# Altium schematic symbol library jlcpcb_2025_04_capacitors_extended_0402.schlib: 3594 symbols (part 12 of 20)
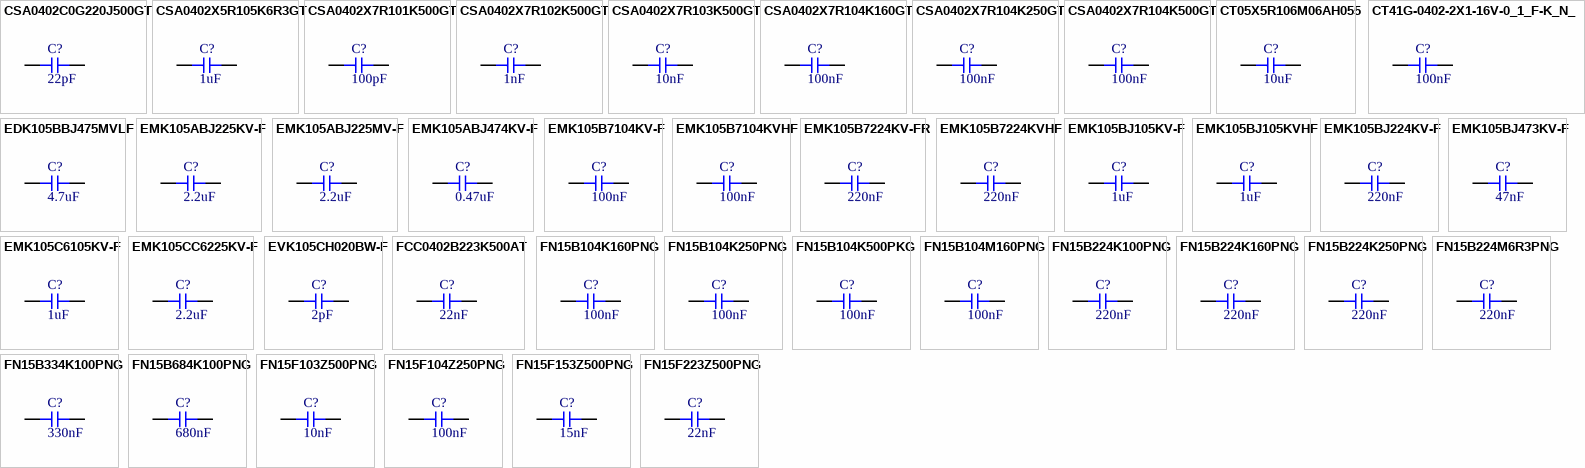
[diagram p100: symbols CSA0402C0G220J500GT to FN15F223Z500PNG]

## EMK105ABJ225KV-F
designator C?  Capacitance: 2.2uF  (hidden comment: *)
Capacitor, Ceramic (MLCC), 2.2uF, ±10%, 16V, X5R, ±10%, SMD 0402; Manufacturer: Taiyo Yuden; Manufacturer Part Number: EMK105ABJ225KV-F; Package Size: 0402; JLCPCB Basic Part: No; JLCPCB Part Number: C385887; Supplier 1: LCSC; Category: Capacitors - MLCC; Supplier Part Number 1: C385887; Tolerance: ±10%; Voltage Rating: 16V; Temperature Coefficient: X5R; RoHS: Yes; ComponentLink1Description: Datasheet; ComponentLink1URL: https://wmsc.lcsc.com/wmsc/upload/file/pdf/v2/lcsc/1912111437_Taiyo-Yuden-EMK105ABJ225KV-F_C385887.pdf; ComponentLink2Description: JLCPCB Part URL; ComponentLink2URL: https://jlcpcb.com/partdetail/C385887; ComponentLink3Description: LCSC Part URL; ComponentLink3URL: https://lcsc.com/product-detail/Multilayer-Ceramic-Capacitors-MLCC---SMD-SMT_Taiyo-Yuden-Taiyo-Yuden-EMK105ABJ225KV-F_C385887.html
footprint CAP-0402 (0402 (1005M) Capacitor)
pins: 1, 2

## EMK105ABJ225MV-F
designator C?  Capacitance: 2.2uF  (hidden comment: *)
Capacitor, Ceramic (MLCC), 2.2uF, ±20%, 16V, X5R, ±20%, SMD 0402; Manufacturer: Taiyo Yuden; Manufacturer Part Number: EMK105ABJ225MV-F; Package Size: 0402; JLCPCB Basic Part: No; JLCPCB Part Number: C412303; Supplier 1: LCSC; Category: Capacitors - MLCC; Supplier Part Number 1: C412303; Tolerance: ±20%; Voltage Rating: 16V; Temperature Coefficient: X5R; RoHS: Yes; ComponentLink1Description: Datasheet; ComponentLink1URL: https://wmsc.lcsc.com/wmsc/upload/file/pdf/v2/lcsc/2211282230_Taiyo-Yuden-EMK105ABJ225MV-F_C412303.pdf; ComponentLink2Description: JLCPCB Part URL; ComponentLink2URL: https://jlcpcb.com/partdetail/C412303; ComponentLink3Description: LCSC Part URL; ComponentLink3URL: https://lcsc.com/product-detail/Multilayer-Ceramic-Capacitors-MLCC---SMD-SMT_Taiyo-Yuden-Taiyo-Yuden-EMK105ABJ225MV-F_C412303.html
footprint CAP-0402 (0402 (1005M) Capacitor)
pins: 1, 2

## EMK105ABJ474KV-F
designator C?  Capacitance: 0.47uF  (hidden comment: *)
Capacitor, Ceramic (MLCC), 0.47uF, ±10%, 16V, X5R, ±10%, SMD 0402; Manufacturer: Taiyo Yuden; Manufacturer Part Number: EMK105ABJ474KV-F; Package Size: 0402; JLCPCB Basic Part: No; JLCPCB Part Number: C2169173; Supplier 1: LCSC; Category: Capacitors - MLCC; Supplier Part Number 1: C2169173; Tolerance: ±10%; Voltage Rating: 16V; Temperature Coefficient: X5R; RoHS: Yes; ComponentLink1Description: Datasheet; ComponentLink1URL: https://wmsc.lcsc.com/wmsc/upload/file/pdf/v2/lcsc/2211282030_Taiyo-Yuden-EMK105ABJ474KV-F_C2169173.pdf; ComponentLink2Description: JLCPCB Part URL; ComponentLink2URL: https://jlcpcb.com/partdetail/C2169173; ComponentLink3Description: LCSC Part URL; ComponentLink3URL: https://lcsc.com/product-detail/Multilayer-Ceramic-Capacitors-MLCC---SMD-SMT_Taiyo-Yuden-Taiyo-Yuden-EMK105ABJ474KV-F_C2169173.html
footprint CAP-0402 (0402 (1005M) Capacitor)
pins: 1, 2

## EMK105B7104KV-F
designator C?  Capacitance: 100nF  (hidden comment: *)
Capacitor, Ceramic (MLCC), 100nF, ±10%, 16V, X7R, ±10%, SMD 0402; Manufacturer: Taiyo Yuden; Manufacturer Part Number: EMK105B7104KV-F; Package Size: 0402; JLCPCB Basic Part: No; JLCPCB Part Number: C92753; Supplier 1: LCSC; Category: Capacitors - MLCC; Supplier Part Number 1: C92753; Tolerance: ±10%; Voltage Rating: 16V; Temperature Coefficient: X7R; RoHS: Yes; ComponentLink1Description: Datasheet; ComponentLink1URL: https://wmsc.lcsc.com/wmsc/upload/file/pdf/v2/lcsc/1810171713_Taiyo-Yuden-EMK105B7104KV-F_C92753.pdf; ComponentLink2Description: JLCPCB Part URL; ComponentLink2URL: https://jlcpcb.com/partdetail/C92753; ComponentLink3Description: LCSC Part URL; ComponentLink3URL: https://lcsc.com/product-detail/Multilayer-Ceramic-Capacitors-MLCC---SMD-SMT_Taiyo-Yuden-Taiyo-Yuden-EMK105B7104KV-F_C92753.html
footprint CAP-0402 (0402 (1005M) Capacitor)
pins: 1, 2

## EMK105B7104KVHF
designator C?  Capacitance: 100nF  (hidden comment: *)
Capacitor, Ceramic (MLCC), 100nF, ±10%, 16V, X7R, ±10%, SMD 0402; Manufacturer: Taiyo Yuden; Manufacturer Part Number: EMK105B7104KVHF; Package Size: 0402; JLCPCB Basic Part: No; JLCPCB Part Number: C385888; Supplier 1: LCSC; Category: Capacitors - MLCC; Supplier Part Number 1: C385888; Tolerance: ±10%; Voltage Rating: 16V; Temperature Coefficient: X7R; RoHS: Yes; ComponentLink1Description: Datasheet; ComponentLink1URL: https://wmsc.lcsc.com/wmsc/upload/file/pdf/v2/lcsc/2211282230_Taiyo-Yuden-EMK105B7104KVHF_C385888.pdf; ComponentLink2Description: JLCPCB Part URL; ComponentLink2URL: https://jlcpcb.com/partdetail/C385888; ComponentLink3Description: LCSC Part URL; ComponentLink3URL: https://lcsc.com/product-detail/Multilayer-Ceramic-Capacitors-MLCC---SMD-SMT_Taiyo-Yuden-Taiyo-Yuden-EMK105B7104KVHF_C385888.html
footprint CAP-0402 (0402 (1005M) Capacitor)
pins: 1, 2

## EMK105B7224KV-FR
designator C?  Capacitance: 220nF  (hidden comment: *)
Capacitor, Ceramic (MLCC), 220nF, ±10%, 16V, X7R, ±10%, SMD 0402; Manufacturer: Taiyo Yuden; Manufacturer Part Number: EMK105B7224KV-FR; Package Size: 0402; JLCPCB Basic Part: No; JLCPCB Part Number: C92754; Supplier 1: LCSC; Category: Capacitors - MLCC; Supplier Part Number 1: C92754; Tolerance: ±10%; Voltage Rating: 16V; Temperature Coefficient: X7R; RoHS: Yes; ComponentLink1Description: Datasheet; ComponentLink1URL: https://wmsc.lcsc.com/wmsc/upload/file/pdf/v2/lcsc/1810171733_Taiyo-Yuden-EMK105B7224KV-FR_C92754.pdf; ComponentLink2Description: JLCPCB Part URL; ComponentLink2URL: https://jlcpcb.com/partdetail/C92754; ComponentLink3Description: LCSC Part URL; ComponentLink3URL: https://lcsc.com/product-detail/Multilayer-Ceramic-Capacitors-MLCC---SMD-SMT_Taiyo-Yuden-Taiyo-Yuden-EMK105B7224KV-FR_C92754.html
footprint CAP-0402 (0402 (1005M) Capacitor)
pins: 1, 2

## EMK105B7224KVHF
designator C?  Capacitance: 220nF  (hidden comment: *)
Capacitor, Ceramic (MLCC), 220nF, ±10%, 16V, X7R, ±10%, SMD 0402; Manufacturer: Taiyo Yuden; Manufacturer Part Number: EMK105B7224KVHF; Package Size: 0402; JLCPCB Basic Part: No; JLCPCB Part Number: C385889; Supplier 1: LCSC; Category: Capacitors - MLCC; Supplier Part Number 1: C385889; Tolerance: ±10%; Voltage Rating: 16V; Temperature Coefficient: X7R; RoHS: Yes; ComponentLink1Description: Datasheet; ComponentLink1URL: https://wmsc.lcsc.com/wmsc/upload/file/pdf/v2/lcsc/2304140030_Taiyo-Yuden-EMK105B7224KVHF_C385889.pdf; ComponentLink2Description: JLCPCB Part URL; ComponentLink2URL: https://jlcpcb.com/partdetail/C385889; ComponentLink3Description: LCSC Part URL; ComponentLink3URL: https://lcsc.com/product-detail/Multilayer-Ceramic-Capacitors-MLCC---SMD-SMT_Taiyo-Yuden-Taiyo-Yuden-EMK105B7224KVHF_C385889.html
footprint CAP-0402 (0402 (1005M) Capacitor)
pins: 1, 2

## EMK105BJ105KV-F
designator C?  Capacitance: 1uF  (hidden comment: *)
Capacitor, Ceramic (MLCC), 1uF, ±10%, 16V, X5R, ±10%, SMD 0402; Manufacturer: Taiyo Yuden; Manufacturer Part Number: EMK105BJ105KV-F; Package Size: 0402; JLCPCB Basic Part: No; JLCPCB Part Number: C92755; Supplier 1: LCSC; Category: Capacitors - MLCC; Supplier Part Number 1: C92755; Tolerance: ±10%; Voltage Rating: 16V; Temperature Coefficient: X5R; RoHS: Yes; ComponentLink1Description: Datasheet; ComponentLink1URL: https://wmsc.lcsc.com/wmsc/upload/file/pdf/v2/lcsc/1810201530_Taiyo-Yuden-EMK105BJ105KV-F_C92755.pdf; ComponentLink2Description: JLCPCB Part URL; ComponentLink2URL: https://jlcpcb.com/partdetail/C92755; ComponentLink3Description: LCSC Part URL; ComponentLink3URL: https://lcsc.com/product-detail/Multilayer-Ceramic-Capacitors-MLCC---SMD-SMT_Taiyo-Yuden-Taiyo-Yuden-EMK105BJ105KV-F_C92755.html
footprint CAP-0402 (0402 (1005M) Capacitor)
pins: 1, 2

## EMK105BJ105KVHF
designator C?  Capacitance: 1uF  (hidden comment: *)
Capacitor, Ceramic (MLCC), 1uF, ±10%, 16V, X5R, ±10%, SMD 0402; Manufacturer: Taiyo Yuden; Manufacturer Part Number: EMK105BJ105KVHF; Package Size: 0402; JLCPCB Basic Part: No; JLCPCB Part Number: C385891; Supplier 1: LCSC; Category: Capacitors - MLCC; Supplier Part Number 1: C385891; Tolerance: ±10%; Voltage Rating: 16V; Temperature Coefficient: X5R; RoHS: Yes; ComponentLink1Description: Datasheet; ComponentLink1URL: https://wmsc.lcsc.com/wmsc/upload/file/pdf/v2/lcsc/2211282230_Taiyo-Yuden-EMK105BJ105KVHF_C385891.pdf; ComponentLink2Description: JLCPCB Part URL; ComponentLink2URL: https://jlcpcb.com/partdetail/C385891; ComponentLink3Description: LCSC Part URL; ComponentLink3URL: https://lcsc.com/product-detail/Multilayer-Ceramic-Capacitors-MLCC---SMD-SMT_Taiyo-Yuden-Taiyo-Yuden-EMK105BJ105KVHF_C385891.html
footprint CAP-0402 (0402 (1005M) Capacitor)
pins: 1, 2

## EMK105BJ224KV-F
designator C?  Capacitance: 220nF  (hidden comment: *)
Capacitor, Ceramic (MLCC), 220nF, ±10%, 16V, X5R, ±10%, SMD 0402; Manufacturer: Taiyo Yuden; Manufacturer Part Number: EMK105BJ224KV-F; Package Size: 0402; JLCPCB Basic Part: No; JLCPCB Part Number: C92756; Supplier 1: LCSC; Category: Capacitors - MLCC; Supplier Part Number 1: C92756; Tolerance: ±10%; Voltage Rating: 16V; Temperature Coefficient: X5R; RoHS: Yes; ComponentLink1Description: Datasheet; ComponentLink1URL: https://wmsc.lcsc.com/wmsc/upload/file/pdf/v2/lcsc/1810301024_Taiyo-Yuden-EMK105BJ224KV-F_C92756.pdf; ComponentLink2Description: JLCPCB Part URL; ComponentLink2URL: https://jlcpcb.com/partdetail/C92756; ComponentLink3Description: LCSC Part URL; ComponentLink3URL: https://lcsc.com/product-detail/Multilayer-Ceramic-Capacitors-MLCC---SMD-SMT_Taiyo-Yuden-Taiyo-Yuden-EMK105BJ224KV-F_C92756.html
footprint CAP-0402 (0402 (1005M) Capacitor)
pins: 1, 2

## EMK105BJ473KV-F
designator C?  Capacitance: 47nF  (hidden comment: *)
Capacitor, Ceramic (MLCC), 47nF, ±10%, 16V, X5R, ±10%, SMD 0402; Manufacturer: Taiyo Yuden; Manufacturer Part Number: EMK105BJ473KV-F; Package Size: 0402; JLCPCB Basic Part: No; JLCPCB Part Number: C92757; Supplier 1: LCSC; Category: Capacitors - MLCC; Supplier Part Number 1: C92757; Tolerance: ±10%; Voltage Rating: 16V; Temperature Coefficient: X5R; RoHS: Yes; ComponentLink1Description: Datasheet; ComponentLink1URL: https://wmsc.lcsc.com/wmsc/upload/file/pdf/v2/lcsc/1810171733_Taiyo-Yuden-EMK105BJ473KV-F_C92757.pdf; ComponentLink2Description: JLCPCB Part URL; ComponentLink2URL: https://jlcpcb.com/partdetail/C92757; ComponentLink3Description: LCSC Part URL; ComponentLink3URL: https://lcsc.com/product-detail/Multilayer-Ceramic-Capacitors-MLCC---SMD-SMT_Taiyo-Yuden-Taiyo-Yuden-EMK105BJ473KV-F_C92757.html
footprint CAP-0402 (0402 (1005M) Capacitor)
pins: 1, 2

## EMK105C6105KV-F
designator C?  Capacitance: 1uF  (hidden comment: *)
Capacitor, Ceramic (MLCC), 1uF, ±10%, 16V, X6S, ±10%, SMD 0402; Manufacturer: Taiyo Yuden; Manufacturer Part Number: EMK105C6105KV-F; Package Size: 0402; JLCPCB Basic Part: No; JLCPCB Part Number: C697610; Supplier 1: LCSC; Category: Capacitors - MLCC; Supplier Part Number 1: C697610; Tolerance: ±10%; Voltage Rating: 16V; Temperature Coefficient: X6S; RoHS: Yes; ComponentLink1Description: Datasheet; ComponentLink1URL: https://wmsc.lcsc.com/wmsc/upload/file/pdf/v2/lcsc/2010272034_Taiyo-Yuden-EMK105C6105KV-F_C697610.pdf; ComponentLink2Description: JLCPCB Part URL; ComponentLink2URL: https://jlcpcb.com/partdetail/C697610; ComponentLink3Description: LCSC Part URL; ComponentLink3URL: https://lcsc.com/product-detail/Multilayer-Ceramic-Capacitors-MLCC---SMD-SMT_Taiyo-Yuden-Taiyo-Yuden-EMK105C6105KV-F_C697610.html
footprint CAP-0402 (0402 (1005M) Capacitor)
pins: 1, 2

## EMK105CC6225KV-F
designator C?  Capacitance: 2.2uF  (hidden comment: *)
Capacitor, Ceramic (MLCC), 2.2uF, ±10%, 16V, X6S, ±10%, SMD 0402; Manufacturer: Taiyo Yuden; Manufacturer Part Number: EMK105CC6225KV-F; Package Size: 0402; JLCPCB Basic Part: No; JLCPCB Part Number: C697612; Supplier 1: LCSC; Category: Capacitors - MLCC; Supplier Part Number 1: C697612; Tolerance: ±10%; Voltage Rating: 16V; Temperature Coefficient: X6S; RoHS: Yes; ComponentLink1Description: Datasheet; ComponentLink1URL: https://wmsc.lcsc.com/wmsc/upload/file/pdf/v2/lcsc/2010291104_Taiyo-Yuden-EMK105CC6225KV-F_C697612.pdf; ComponentLink2Description: JLCPCB Part URL; ComponentLink2URL: https://jlcpcb.com/partdetail/C697612; ComponentLink3Description: LCSC Part URL; ComponentLink3URL: https://lcsc.com/product-detail/Multilayer-Ceramic-Capacitors-MLCC---SMD-SMT_Taiyo-Yuden-Taiyo-Yuden-EMK105CC6225KV-F_C697612.html
footprint CAP-0402 (0402 (1005M) Capacitor)
pins: 1, 2

## EVK105CH020BW-F
designator C?  Capacitance: 2pF  (hidden comment: *)
Capacitor, Ceramic (MLCC), 2pF, 16V, C0H, SMD 0402; Manufacturer: Taiyo Yuden; Manufacturer Part Number: EVK105CH020BW-F; Package Size: 0402; JLCPCB Basic Part: No; JLCPCB Part Number: C524942; Supplier 1: LCSC; Category: Capacitors - MLCC; Supplier Part Number 1: C524942; Voltage Rating: 16V; Temperature Coefficient: C0H; RoHS: Yes; ComponentLink1Description: Datasheet; ComponentLink2Description: JLCPCB Part URL; ComponentLink2URL: https://jlcpcb.com/partdetail/C524942; ComponentLink3Description: LCSC Part URL; ComponentLink3URL: https://lcsc.com/product-detail/Multilayer-Ceramic-Capacitors-MLCC---SMD-SMT_Taiyo-Yuden-Taiyo-Yuden-EVK105CH020BW-F_C524942.html
footprint CAP-0402 (0402 (1005M) Capacitor)
pins: 1, 2

## FCC0402B223K500AT
designator C?  Capacitance: 22nF  (hidden comment: *)
Capacitor, Ceramic (MLCC), 22nF, ±10%, 50V, X7R, ±10%, SMD 0402; Manufacturer: FOJAN; Manufacturer Part Number: FCC0402B223K500AT; Package Size: 0402; JLCPCB Basic Part: No; JLCPCB Part Number: C5137627; Supplier 1: LCSC; Category: Capacitors - MLCC; Supplier Part Number 1: C5137627; Tolerance: ±10%; Voltage Rating: 50V; Temperature Coefficient: X7R; RoHS: Yes; ComponentLink1Description: Datasheet; ComponentLink1URL: https://wmsc.lcsc.com/wmsc/upload/file/pdf/v2/lcsc/2208181800_FOJAN-FCC0402B223K500AT_C5137627.pdf; ComponentLink2Description: JLCPCB Part URL; ComponentLink2URL: https://jlcpcb.com/partdetail/C5137627; ComponentLink3Description: LCSC Part URL; ComponentLink3URL: https://lcsc.com/product-detail/Multilayer-Ceramic-Capacitors-MLCC---SMD-SMT_FOJAN-FOJAN-FCC0402B223K500AT_C5137627.html
footprint CAP-0402 (0402 (1005M) Capacitor)
pins: 1, 2

## FN15B104K160PNG
designator C?  Capacitance: 100nF  (hidden comment: *)
Capacitor, Ceramic (MLCC), 100nF, ±10%, 16V, X5R, ±10%, SMD 0402; Manufacturer: PSA(Prosperity Dielectrics); Manufacturer Part Number: FN15B104K160PNG; Package Size: 0402; JLCPCB Basic Part: No; JLCPCB Part Number: C2874742; Supplier 1: LCSC; Category: Capacitors - MLCC; Supplier Part Number 1: C2874742; Tolerance: ±10%; Voltage Rating: 16V; Temperature Coefficient: X5R; RoHS: Yes; ComponentLink1Description: Datasheet; ComponentLink1URL: https://wmsc.lcsc.com/wmsc/upload/file/pdf/v2/lcsc/2108150330_PSA-Prosperity-Dielectrics-FN15B104K160PNG_C2874742.pdf; ComponentLink2Description: JLCPCB Part URL; ComponentLink2URL: https://jlcpcb.com/partdetail/C2874742; ComponentLink3Description: LCSC Part URL; ComponentLink3URL: https://lcsc.com/product-detail/Multilayer-Ceramic-Capacitors-MLCC---SMD-SMT_PSAProsperity-Dielectrics-PSAProsperity-Dielectrics-FN15B104K160PNG_C2874742.html
footprint CAP-0402 (0402 (1005M) Capacitor)
pins: 1, 2

## FN15B104K250PNG
designator C?  Capacitance: 100nF  (hidden comment: *)
Capacitor, Ceramic (MLCC), 100nF, ±10%, 25V, X5R, ±10%, SMD 0402; Manufacturer: PSA(Prosperity Dielectrics); Manufacturer Part Number: FN15B104K250PNG; Package Size: 0402; JLCPCB Basic Part: No; JLCPCB Part Number: C394158; Supplier 1: LCSC; Category: Capacitors - MLCC; Supplier Part Number 1: C394158; Tolerance: ±10%; Voltage Rating: 25V; Temperature Coefficient: X5R; RoHS: Yes; ComponentLink1Description: Datasheet; ComponentLink1URL: https://wmsc.lcsc.com/wmsc/upload/file/pdf/v2/lcsc/2304140030_PSA-Prosperity-Dielectrics-FN15B104K250PNG_C394158.pdf; ComponentLink2Description: JLCPCB Part URL; ComponentLink2URL: https://jlcpcb.com/partdetail/C394158; ComponentLink3Description: LCSC Part URL; ComponentLink3URL: https://lcsc.com/product-detail/Multilayer-Ceramic-Capacitors-MLCC---SMD-SMT_PSAProsperity-Dielectrics-PSAProsperity-Dielectrics-FN15B104K250PNG_C394158.html
footprint CAP-0402 (0402 (1005M) Capacitor)
pins: 1, 2

## FN15B104K500PKG
designator C?  Capacitance: 100nF  (hidden comment: *)
Capacitor, Ceramic (MLCC), 100nF, ±10%, 50V, ±10%, SMD 0402; Manufacturer: PSA(Prosperity Dielectrics); Manufacturer Part Number: FN15B104K500PKG; Package Size: 0402; JLCPCB Basic Part: No; JLCPCB Part Number: C525196; Supplier 1: LCSC; Category: Capacitors - MLCC; Supplier Part Number 1: C525196; Tolerance: ±10%; Voltage Rating: 50V; RoHS: Yes; ComponentLink1Description: Datasheet; ComponentLink1URL: https://wmsc.lcsc.com/wmsc/upload/file/pdf/v2/lcsc/2304140030_PSA-Prosperity-Dielectrics-FN15B104K500PKG_C525196.pdf; ComponentLink2Description: JLCPCB Part URL; ComponentLink2URL: https://jlcpcb.com/partdetail/C525196; ComponentLink3Description: LCSC Part URL; ComponentLink3URL: https://lcsc.com/product-detail/Multilayer-Ceramic-Capacitors-MLCC---SMD-SMT_PSAProsperity-Dielectrics-PSAProsperity-Dielectrics-FN15B104K500PKG_C525196.html
footprint CAP-0402 (0402 (1005M) Capacitor)
pins: 1, 2

## FN15B104M160PNG
designator C?  Capacitance: 100nF  (hidden comment: *)
Capacitor, Ceramic (MLCC), 100nF, ±20%, 16V, X5R, ±20%, SMD 0402; Manufacturer: PSA(Prosperity Dielectrics); Manufacturer Part Number: FN15B104M160PNG; Package Size: 0402; JLCPCB Basic Part: No; JLCPCB Part Number: C2874743; Supplier 1: LCSC; Category: Capacitors - MLCC; Supplier Part Number 1: C2874743; Tolerance: ±20%; Voltage Rating: 16V; Temperature Coefficient: X5R; RoHS: Yes; ComponentLink1Description: Datasheet; ComponentLink1URL: https://wmsc.lcsc.com/wmsc/upload/file/pdf/v2/lcsc/2108150330_PSA-Prosperity-Dielectrics-FN15B104M160PNG_C2874743.pdf; ComponentLink2Description: JLCPCB Part URL; ComponentLink2URL: https://jlcpcb.com/partdetail/C2874743; ComponentLink3Description: LCSC Part URL; ComponentLink3URL: https://lcsc.com/product-detail/Multilayer-Ceramic-Capacitors-MLCC---SMD-SMT_PSAProsperity-Dielectrics-PSAProsperity-Dielectrics-FN15B104M160PNG_C2874743.html
footprint CAP-0402 (0402 (1005M) Capacitor)
pins: 1, 2

## FN15B224K100PNG
designator C?  Capacitance: 220nF  (hidden comment: *)
Capacitor, Ceramic (MLCC), 220nF, ±10%, 10V, X5R, ±10%, SMD 0402; Manufacturer: PSA(Prosperity Dielectrics); Manufacturer Part Number: FN15B224K100PNG; Package Size: 0402; JLCPCB Basic Part: No; JLCPCB Part Number: C363525; Supplier 1: LCSC; Category: Capacitors - MLCC; Supplier Part Number 1: C363525; Tolerance: ±10%; Voltage Rating: 10V; Temperature Coefficient: X5R; RoHS: Yes; ComponentLink1Description: Datasheet; ComponentLink1URL: https://wmsc.lcsc.com/wmsc/upload/file/pdf/v2/lcsc/2304140030_PSA-Prosperity-Dielectrics-FN15B224K100PNG_C363525.pdf; ComponentLink2Description: JLCPCB Part URL; ComponentLink2URL: https://jlcpcb.com/partdetail/C363525; ComponentLink3Description: LCSC Part URL; ComponentLink3URL: https://lcsc.com/product-detail/Multilayer-Ceramic-Capacitors-MLCC---SMD-SMT_PSAProsperity-Dielectrics-PSAProsperity-Dielectrics-FN15B224K100PNG_C363525.html
footprint CAP-0402 (0402 (1005M) Capacitor)
pins: 1, 2

## FN15B224K160PNG
designator C?  Capacitance: 220nF  (hidden comment: *)
Capacitor, Ceramic (MLCC), 220nF, ±10%, 16V, X5R, ±10%, SMD 0402; Manufacturer: PSA(Prosperity Dielectrics); Manufacturer Part Number: FN15B224K160PNG; Package Size: 0402; JLCPCB Basic Part: No; JLCPCB Part Number: C464967; Supplier 1: LCSC; Category: Capacitors - MLCC; Supplier Part Number 1: C464967; Tolerance: ±10%; Voltage Rating: 16V; Temperature Coefficient: X5R; RoHS: Yes; ComponentLink1Description: Datasheet; ComponentLink1URL: https://wmsc.lcsc.com/wmsc/upload/file/pdf/v2/lcsc/2304140030_PSA-Prosperity-Dielectrics-FN15B224K160PNG_C464967.pdf; ComponentLink2Description: JLCPCB Part URL; ComponentLink2URL: https://jlcpcb.com/partdetail/C464967; ComponentLink3Description: LCSC Part URL; ComponentLink3URL: https://lcsc.com/product-detail/Multilayer-Ceramic-Capacitors-MLCC---SMD-SMT_PSAProsperity-Dielectrics-PSAProsperity-Dielectrics-FN15B224K160PNG_C464967.html
footprint CAP-0402 (0402 (1005M) Capacitor)
pins: 1, 2

## FN15B224K250PNG
designator C?  Capacitance: 220nF  (hidden comment: *)
Capacitor, Ceramic (MLCC), 220nF, 25V, X5R, SMD 0402; Manufacturer: PSA(Prosperity Dielectrics); Manufacturer Part Number: FN15B224K250PNG; Package Size: 0402; JLCPCB Basic Part: No; JLCPCB Part Number: C2929125; Supplier 1: LCSC; Category: Capacitors - MLCC; Supplier Part Number 1: C2929125; Voltage Rating: 25V; Temperature Coefficient: X5R; RoHS: Yes; ComponentLink1Description: Datasheet; ComponentLink1URL: https://wmsc.lcsc.com/wmsc/upload/file/pdf/v2/lcsc/2201121400_PSA-Prosperity-Dielectrics-FN15B224K250PNG_C2929125.pdf; ComponentLink2Description: JLCPCB Part URL; ComponentLink2URL: https://jlcpcb.com/partdetail/C2929125; ComponentLink3Description: LCSC Part URL; ComponentLink3URL: https://lcsc.com/product-detail/Multilayer-Ceramic-Capacitors-MLCC---SMD-SMT_PSAProsperity-Dielectrics-PSAProsperity-Dielectrics-FN15B224K250PNG_C2929125.html
footprint CAP-0402 (0402 (1005M) Capacitor)
pins: 1, 2

## FN15B224M6R3PNG
designator C?  Capacitance: 220nF  (hidden comment: *)
Capacitor, Ceramic (MLCC), 220nF, 6.3V, X5R, SMD 0402; Manufacturer: PSA(Prosperity Dielectrics); Manufacturer Part Number: FN15B224M6R3PNG; Package Size: 0402; JLCPCB Basic Part: No; JLCPCB Part Number: C2929126; Supplier 1: LCSC; Category: Capacitors - MLCC; Supplier Part Number 1: C2929126; Voltage Rating: 6.3V; Temperature Coefficient: X5R; RoHS: Yes; ComponentLink1Description: Datasheet; ComponentLink1URL: https://wmsc.lcsc.com/wmsc/upload/file/pdf/v2/lcsc/2201121400_PSA-Prosperity-Dielectrics-FN15B224M6R3PNG_C2929126.pdf; ComponentLink2Description: JLCPCB Part URL; ComponentLink2URL: https://jlcpcb.com/partdetail/C2929126; ComponentLink3Description: LCSC Part URL; ComponentLink3URL: https://lcsc.com/product-detail/Multilayer-Ceramic-Capacitors-MLCC---SMD-SMT_PSAProsperity-Dielectrics-PSAProsperity-Dielectrics-FN15B224M6R3PNG_C2929126.html
footprint CAP-0402 (0402 (1005M) Capacitor)
pins: 1, 2

## FN15B334K100PNG
designator C?  Capacitance: 330nF  (hidden comment: *)
Capacitor, Ceramic (MLCC), 330nF, ±10%, 10V, X5R, ±10%, SMD 0402; Manufacturer: PSA(Prosperity Dielectrics); Manufacturer Part Number: FN15B334K100PNG; Package Size: 0402; JLCPCB Basic Part: No; JLCPCB Part Number: C2915667; Supplier 1: LCSC; Category: Capacitors - MLCC; Supplier Part Number 1: C2915667; Tolerance: ±10%; Voltage Rating: 10V; Temperature Coefficient: X5R; RoHS: Yes; ComponentLink1Description: Datasheet; ComponentLink1URL: https://wmsc.lcsc.com/wmsc/upload/file/pdf/v2/lcsc/2111172030_PSA-Prosperity-Dielectrics-FN15B334K100PNG_C2915667.pdf; ComponentLink2Description: JLCPCB Part URL; ComponentLink2URL: https://jlcpcb.com/partdetail/C2915667; ComponentLink3Description: LCSC Part URL; ComponentLink3URL: https://lcsc.com/product-detail/Multilayer-Ceramic-Capacitors-MLCC---SMD-SMT_PSAProsperity-Dielectrics-PSAProsperity-Dielectrics-FN15B334K100PNG_C2915667.html
footprint CAP-0402 (0402 (1005M) Capacitor)
pins: 1, 2

## FN15B684K100PNG
designator C?  Capacitance: 680nF  (hidden comment: *)
Capacitor, Ceramic (MLCC), 680nF, 10V, X5R, SMD 0402; Manufacturer: PSA(Prosperity Dielectrics); Manufacturer Part Number: FN15B684K100PNG; Package Size: 0402; JLCPCB Basic Part: No; JLCPCB Part Number: C2929127; Supplier 1: LCSC; Category: Capacitors - MLCC; Supplier Part Number 1: C2929127; Voltage Rating: 10V; Temperature Coefficient: X5R; RoHS: Yes; ComponentLink1Description: Datasheet; ComponentLink1URL: https://wmsc.lcsc.com/wmsc/upload/file/pdf/v2/lcsc/2201121400_PSA-Prosperity-Dielectrics-FN15B684K100PNG_C2929127.pdf; ComponentLink2Description: JLCPCB Part URL; ComponentLink2URL: https://jlcpcb.com/partdetail/C2929127; ComponentLink3Description: LCSC Part URL; ComponentLink3URL: https://lcsc.com/product-detail/Multilayer-Ceramic-Capacitors-MLCC---SMD-SMT_PSAProsperity-Dielectrics-PSAProsperity-Dielectrics-FN15B684K100PNG_C2929127.html
footprint CAP-0402 (0402 (1005M) Capacitor)
pins: 1, 2

## FN15F103Z500PNG
designator C?  Capacitance: 10nF  (hidden comment: *)
Capacitor, Ceramic (MLCC), 10nF, 50V, Y5V, SMD 0402; Manufacturer: PSA(Prosperity Dielectrics); Manufacturer Part Number: FN15F103Z500PNG; Temperature Rating: -20%~+80%; Package Size: 0402; JLCPCB Basic Part: No; JLCPCB Part Number: C565544; Supplier 1: LCSC; Category: Capacitors - MLCC; Supplier Part Number 1: C565544; Voltage Rating: 50V; Temperature Coefficient: Y5V; RoHS: Yes; ComponentLink1Description: Datasheet; ComponentLink2Description: JLCPCB Part URL; ComponentLink2URL: https://jlcpcb.com/partdetail/C565544; ComponentLink3Description: LCSC Part URL; ComponentLink3URL: https://lcsc.com/product-detail/Multilayer-Ceramic-Capacitors-MLCC---SMD-SMT_PSAProsperity-Dielectrics-PSAProsperity-Dielectrics-FN15F103Z500PNG_C565544.html
footprint CAP-0402 (0402 (1005M) Capacitor)
pins: 1, 2

## FN15F104Z250PNG
designator C?  Capacitance: 100nF  (hidden comment: *)
Capacitor, Ceramic (MLCC), 100nF, 25V, Y5V, SMD 0402; Manufacturer: PSA(Prosperity Dielectrics); Manufacturer Part Number: FN15F104Z250PNG; Temperature Rating: -20%~+80%; Package Size: 0402; JLCPCB Basic Part: No; JLCPCB Part Number: C525197; Supplier 1: LCSC; Category: Capacitors - MLCC; Supplier Part Number 1: C525197; Voltage Rating: 25V; Temperature Coefficient: Y5V; RoHS: Yes; ComponentLink1Description: Datasheet; ComponentLink1URL: https://wmsc.lcsc.com/wmsc/upload/file/pdf/v2/lcsc/2304140030_PSA-Prosperity-Dielectrics-FN15F104Z250PNG_C525197.pdf; ComponentLink2Description: JLCPCB Part URL; ComponentLink2URL: https://jlcpcb.com/partdetail/C525197; ComponentLink3Description: LCSC Part URL; ComponentLink3URL: https://lcsc.com/product-detail/Multilayer-Ceramic-Capacitors-MLCC---SMD-SMT_PSAProsperity-Dielectrics-PSAProsperity-Dielectrics-FN15F104Z250PNG_C525197.html
footprint CAP-0402 (0402 (1005M) Capacitor)
pins: 1, 2

## FN15F153Z500PNG
designator C?  Capacitance: 15nF  (hidden comment: *)
Capacitor, Ceramic (MLCC), 15nF, 50V, SMD 0402; Manufacturer: PSA(Prosperity Dielectrics); Manufacturer Part Number: FN15F153Z500PNG; Temperature Rating: -20%~+80%; Package Size: 0402; JLCPCB Basic Part: No; JLCPCB Part Number: C565545; Supplier 1: LCSC; Category: Capacitors - MLCC; Supplier Part Number 1: C565545; Voltage Rating: 50V; RoHS: Yes; ComponentLink1Description: Datasheet; ComponentLink2Description: JLCPCB Part URL; ComponentLink2URL: https://jlcpcb.com/partdetail/C565545; ComponentLink3Description: LCSC Part URL; ComponentLink3URL: https://lcsc.com/product-detail/Multilayer-Ceramic-Capacitors-MLCC---SMD-SMT_PSAProsperity-Dielectrics-PSAProsperity-Dielectrics-FN15F153Z500PNG_C565545.html
footprint CAP-0402 (0402 (1005M) Capacitor)
pins: 1, 2

## FN15F223Z500PNG
designator C?  Capacitance: 22nF  (hidden comment: *)
Capacitor, Ceramic (MLCC), 22nF, 50V, Y5V, SMD 0402; Manufacturer: PSA(Prosperity Dielectrics); Manufacturer Part Number: FN15F223Z500PNG; Temperature Rating: -20%~+80%; Package Size: 0402; JLCPCB Basic Part: No; JLCPCB Part Number: C565546; Supplier 1: LCSC; Category: Capacitors - MLCC; Supplier Part Number 1: C565546; Voltage Rating: 50V; Temperature Coefficient: Y5V; RoHS: Yes; ComponentLink1Description: Datasheet; ComponentLink2Description: JLCPCB Part URL; ComponentLink2URL: https://jlcpcb.com/partdetail/C565546; ComponentLink3Description: LCSC Part URL; ComponentLink3URL: https://lcsc.com/product-detail/Multilayer-Ceramic-Capacitors-MLCC---SMD-SMT_PSAProsperity-Dielectrics-PSAProsperity-Dielectrics-FN15F223Z500PNG_C565546.html
footprint CAP-0402 (0402 (1005M) Capacitor)
pins: 1, 2

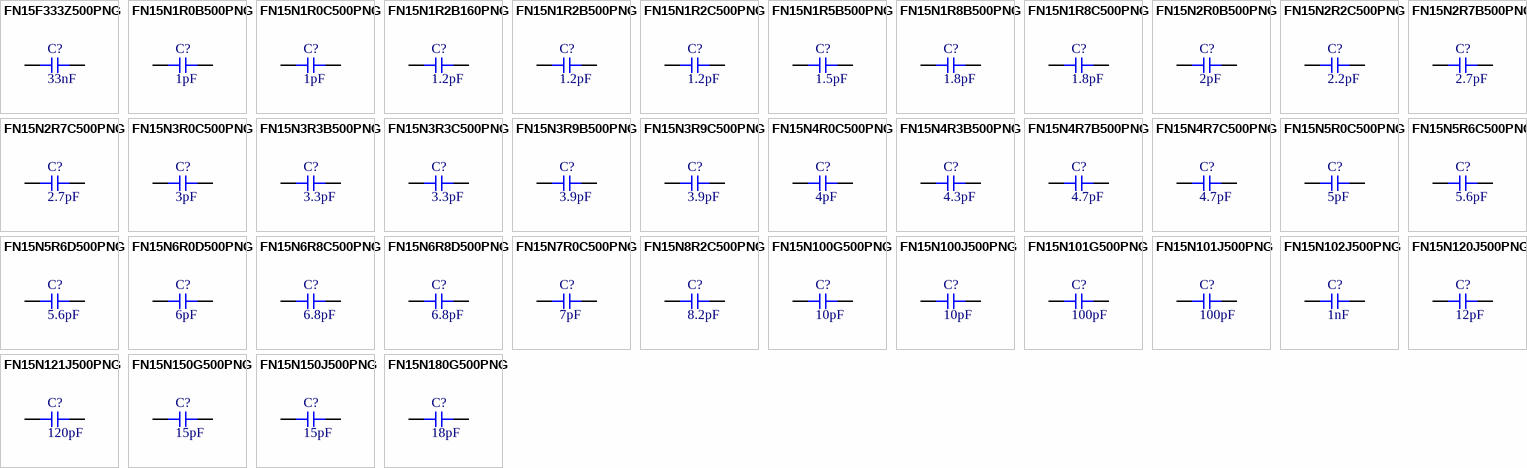
[diagram p52: symbols FN15F333Z500PNG to FN15N180G500PNG]

## FN15F333Z500PNG
designator C?  Capacitance: 33nF  (hidden comment: *)
Capacitor, Ceramic (MLCC), 33nF, 50V, Y5V, SMD 0402; Manufacturer: PSA(Prosperity Dielectrics); Manufacturer Part Number: FN15F333Z500PNG; Temperature Rating: -20%~+80%; Package Size: 0402; JLCPCB Basic Part: No; JLCPCB Part Number: C565547; Supplier 1: LCSC; Category: Capacitors - MLCC; Supplier Part Number 1: C565547; Voltage Rating: 50V; Temperature Coefficient: Y5V; RoHS: Yes; ComponentLink1Description: Datasheet; ComponentLink2Description: JLCPCB Part URL; ComponentLink2URL: https://jlcpcb.com/partdetail/C565547; ComponentLink3Description: LCSC Part URL; ComponentLink3URL: https://lcsc.com/product-detail/Multilayer-Ceramic-Capacitors-MLCC---SMD-SMT_PSAProsperity-Dielectrics-PSAProsperity-Dielectrics-FN15F333Z500PNG_C565547.html
footprint CAP-0402 (0402 (1005M) Capacitor)
pins: 1, 2

## FN15N1R0B500PNG
designator C?  Capacitance: 1pF  (hidden comment: *)
Capacitor, Ceramic (MLCC), 1pF, 50V, C0G, SMD 0402; Manufacturer: PSA(Prosperity Dielectrics); Manufacturer Part Number: FN15N1R0B500PNG; Package Size: 0402; JLCPCB Basic Part: No; JLCPCB Part Number: C525202; Supplier 1: LCSC; Category: Capacitors - MLCC; Supplier Part Number 1: C525202; Voltage Rating: 50V; Temperature Coefficient: C0G; RoHS: Yes; ComponentLink1Description: Datasheet; ComponentLink1URL: https://wmsc.lcsc.com/wmsc/upload/file/pdf/v2/lcsc/2304140030_PSA-Prosperity-Dielectrics-FN15N1R0B500PNG_C525202.pdf; ComponentLink2Description: JLCPCB Part URL; ComponentLink2URL: https://jlcpcb.com/partdetail/C525202; ComponentLink3Description: LCSC Part URL; ComponentLink3URL: https://lcsc.com/product-detail/Multilayer-Ceramic-Capacitors-MLCC---SMD-SMT_PSAProsperity-Dielectrics-PSAProsperity-Dielectrics-FN15N1R0B500PNG_C525202.html
footprint CAP-0402 (0402 (1005M) Capacitor)
pins: 1, 2

## FN15N1R0C500PNG
designator C?  Capacitance: 1pF  (hidden comment: *)
Capacitor, Ceramic (MLCC), 1pF, 50V, C0G, SMD 0402; Manufacturer: PSA(Prosperity Dielectrics); Manufacturer Part Number: FN15N1R0C500PNG; Package Size: 0402; JLCPCB Basic Part: No; JLCPCB Part Number: C363513; Supplier 1: LCSC; Category: Capacitors - MLCC; Supplier Part Number 1: C363513; Voltage Rating: 50V; Temperature Coefficient: C0G; RoHS: Yes; ComponentLink1Description: Datasheet; ComponentLink1URL: https://wmsc.lcsc.com/wmsc/upload/file/pdf/v2/lcsc/2304140030_PSA-Prosperity-Dielectrics-FN15N1R0C500PNG_C363513.pdf; ComponentLink2Description: JLCPCB Part URL; ComponentLink2URL: https://jlcpcb.com/partdetail/C363513; ComponentLink3Description: LCSC Part URL; ComponentLink3URL: https://lcsc.com/product-detail/Multilayer-Ceramic-Capacitors-MLCC---SMD-SMT_PSAProsperity-Dielectrics-PSAProsperity-Dielectrics-FN15N1R0C500PNG_C363513.html
footprint CAP-0402 (0402 (1005M) Capacitor)
pins: 1, 2

## FN15N1R2B160PNG
designator C?  Capacitance: 1.2pF  (hidden comment: *)
Capacitor, Ceramic (MLCC), 1.2pF, 16V, C0G, SMD 0402; Manufacturer: PSA(Prosperity Dielectrics); Manufacturer Part Number: FN15N1R2B160PNG; Package Size: 0402; JLCPCB Basic Part: No; JLCPCB Part Number: C2929129; Supplier 1: LCSC; Category: Capacitors - MLCC; Supplier Part Number 1: C2929129; Voltage Rating: 16V; Temperature Coefficient: C0G; RoHS: Yes; ComponentLink1Description: Datasheet; ComponentLink1URL: https://wmsc.lcsc.com/wmsc/upload/file/pdf/v2/lcsc/2201121400_PSA-Prosperity-Dielectrics-FN15N1R2B160PNG_C2929129.pdf; ComponentLink2Description: JLCPCB Part URL; ComponentLink2URL: https://jlcpcb.com/partdetail/C2929129; ComponentLink3Description: LCSC Part URL; ComponentLink3URL: https://lcsc.com/product-detail/Multilayer-Ceramic-Capacitors-MLCC---SMD-SMT_PSAProsperity-Dielectrics-PSAProsperity-Dielectrics-FN15N1R2B160PNG_C2929129.html
footprint CAP-0402 (0402 (1005M) Capacitor)
pins: 1, 2

## FN15N1R2B500PNG
designator C?  Capacitance: 1.2pF  (hidden comment: *)
Capacitor, Ceramic (MLCC), 1.2pF, 50V, C0G, SMD 0402; Manufacturer: PSA(Prosperity Dielectrics); Manufacturer Part Number: FN15N1R2B500PNG; Package Size: 0402; JLCPCB Basic Part: No; JLCPCB Part Number: C565485; Supplier 1: LCSC; Category: Capacitors - MLCC; Supplier Part Number 1: C565485; Voltage Rating: 50V; Temperature Coefficient: C0G; RoHS: Yes; ComponentLink1Description: Datasheet; ComponentLink2Description: JLCPCB Part URL; ComponentLink2URL: https://jlcpcb.com/partdetail/C565485; ComponentLink3Description: LCSC Part URL; ComponentLink3URL: https://lcsc.com/product-detail/Multilayer-Ceramic-Capacitors-MLCC---SMD-SMT_PSAProsperity-Dielectrics-PSAProsperity-Dielectrics-FN15N1R2B500PNG_C565485.html
footprint CAP-0402 (0402 (1005M) Capacitor)
pins: 1, 2

## FN15N1R2C500PNG
designator C?  Capacitance: 1.2pF  (hidden comment: *)
Capacitor, Ceramic (MLCC), 1.2pF, 50V, C0G, SMD 0402; Manufacturer: PSA(Prosperity Dielectrics); Manufacturer Part Number: FN15N1R2C500PNG; Package Size: 0402; JLCPCB Basic Part: No; JLCPCB Part Number: C363514; Supplier 1: LCSC; Category: Capacitors - MLCC; Supplier Part Number 1: C363514; Voltage Rating: 50V; Temperature Coefficient: C0G; RoHS: Yes; ComponentLink1Description: Datasheet; ComponentLink1URL: https://wmsc.lcsc.com/wmsc/upload/file/pdf/v2/lcsc/2304140030_PSA-Prosperity-Dielectrics-FN15N1R2C500PNG_C363514.pdf; ComponentLink2Description: JLCPCB Part URL; ComponentLink2URL: https://jlcpcb.com/partdetail/C363514; ComponentLink3Description: LCSC Part URL; ComponentLink3URL: https://lcsc.com/product-detail/Multilayer-Ceramic-Capacitors-MLCC---SMD-SMT_PSAProsperity-Dielectrics-PSAProsperity-Dielectrics-FN15N1R2C500PNG_C363514.html
footprint CAP-0402 (0402 (1005M) Capacitor)
pins: 1, 2

## FN15N1R5B500PNG
designator C?  Capacitance: 1.5pF  (hidden comment: *)
Capacitor, Ceramic (MLCC), 1.5pF, 50V, NP0, SMD 0402; Manufacturer: PSA(Prosperity Dielectrics); Manufacturer Part Number: FN15N1R5B500PNG; Package Size: 0402; JLCPCB Basic Part: No; JLCPCB Part Number: C565486; Supplier 1: LCSC; Category: Capacitors - MLCC; Supplier Part Number 1: C565486; Voltage Rating: 50V; Temperature Coefficient: NP0; RoHS: Yes; ComponentLink1Description: Datasheet; ComponentLink2Description: JLCPCB Part URL; ComponentLink2URL: https://jlcpcb.com/partdetail/C565486; ComponentLink3Description: LCSC Part URL; ComponentLink3URL: https://lcsc.com/product-detail/Multilayer-Ceramic-Capacitors-MLCC---SMD-SMT_PSAProsperity-Dielectrics-PSAProsperity-Dielectrics-FN15N1R5B500PNG_C565486.html
footprint CAP-0402 (0402 (1005M) Capacitor)
pins: 1, 2

## FN15N1R8B500PNG
designator C?  Capacitance: 1.8pF  (hidden comment: *)
Capacitor, Ceramic (MLCC), 1.8pF, 50V, C0G, SMD 0402; Manufacturer: PSA(Prosperity Dielectrics); Manufacturer Part Number: FN15N1R8B500PNG; Package Size: 0402; JLCPCB Basic Part: No; JLCPCB Part Number: C565487; Supplier 1: LCSC; Category: Capacitors - MLCC; Supplier Part Number 1: C565487; Voltage Rating: 50V; Temperature Coefficient: C0G; RoHS: Yes; ComponentLink1Description: Datasheet; ComponentLink2Description: JLCPCB Part URL; ComponentLink2URL: https://jlcpcb.com/partdetail/C565487; ComponentLink3Description: LCSC Part URL; ComponentLink3URL: https://lcsc.com/product-detail/Multilayer-Ceramic-Capacitors-MLCC---SMD-SMT_PSAProsperity-Dielectrics-PSAProsperity-Dielectrics-FN15N1R8B500PNG_C565487.html
footprint CAP-0402 (0402 (1005M) Capacitor)
pins: 1, 2

## FN15N1R8C500PNG
designator C?  Capacitance: 1.8pF  (hidden comment: *)
Capacitor, Ceramic (MLCC), 1.8pF, 50V, C0G, SMD 0402; Manufacturer: PSA(Prosperity Dielectrics); Manufacturer Part Number: FN15N1R8C500PNG; Package Size: 0402; JLCPCB Basic Part: No; JLCPCB Part Number: C363515; Supplier 1: LCSC; Category: Capacitors - MLCC; Supplier Part Number 1: C363515; Voltage Rating: 50V; Temperature Coefficient: C0G; RoHS: Yes; ComponentLink1Description: Datasheet; ComponentLink1URL: https://wmsc.lcsc.com/wmsc/upload/file/pdf/v2/lcsc/2304140030_PSA-Prosperity-Dielectrics-FN15N1R8C500PNG_C363515.pdf; ComponentLink2Description: JLCPCB Part URL; ComponentLink2URL: https://jlcpcb.com/partdetail/C363515; ComponentLink3Description: LCSC Part URL; ComponentLink3URL: https://lcsc.com/product-detail/Multilayer-Ceramic-Capacitors-MLCC---SMD-SMT_PSAProsperity-Dielectrics-PSAProsperity-Dielectrics-FN15N1R8C500PNG_C363515.html
footprint CAP-0402 (0402 (1005M) Capacitor)
pins: 1, 2

## FN15N2R0B500PNG
designator C?  Capacitance: 2pF  (hidden comment: *)
Capacitor, Ceramic (MLCC), 2pF, 50V, C0G, SMD 0402; Manufacturer: PSA(Prosperity Dielectrics); Manufacturer Part Number: FN15N2R0B500PNG; Package Size: 0402; JLCPCB Basic Part: No; JLCPCB Part Number: C2875127; Supplier 1: LCSC; Category: Capacitors - MLCC; Supplier Part Number 1: C2875127; Voltage Rating: 50V; Temperature Coefficient: C0G; RoHS: Yes; ComponentLink1Description: Datasheet; ComponentLink1URL: https://wmsc.lcsc.com/wmsc/upload/file/pdf/v2/lcsc/2109171130_PSA-Prosperity-Dielectrics-FN15N2R0B500PNG_C2875127.pdf; ComponentLink2Description: JLCPCB Part URL; ComponentLink2URL: https://jlcpcb.com/partdetail/C2875127; ComponentLink3Description: LCSC Part URL; ComponentLink3URL: https://lcsc.com/product-detail/Multilayer-Ceramic-Capacitors-MLCC---SMD-SMT_PSAProsperity-Dielectrics-PSAProsperity-Dielectrics-FN15N2R0B500PNG_C2875127.html
footprint CAP-0402 (0402 (1005M) Capacitor)
pins: 1, 2

## FN15N2R2C500PNG
designator C?  Capacitance: 2.2pF  (hidden comment: *)
Capacitor, Ceramic (MLCC), 2.2pF, 50V, C0G, SMD 0402; Manufacturer: PSA(Prosperity Dielectrics); Manufacturer Part Number: FN15N2R2C500PNG; Package Size: 0402; JLCPCB Basic Part: No; JLCPCB Part Number: C525207; Supplier 1: LCSC; Category: Capacitors - MLCC; Supplier Part Number 1: C525207; Voltage Rating: 50V; Temperature Coefficient: C0G; RoHS: Yes; ComponentLink1Description: Datasheet; ComponentLink1URL: https://wmsc.lcsc.com/wmsc/upload/file/pdf/v2/lcsc/2304140030_PSA-Prosperity-Dielectrics-FN15N2R2C500PNG_C525207.pdf; ComponentLink2Description: JLCPCB Part URL; ComponentLink2URL: https://jlcpcb.com/partdetail/C525207; ComponentLink3Description: LCSC Part URL; ComponentLink3URL: https://lcsc.com/product-detail/Multilayer-Ceramic-Capacitors-MLCC---SMD-SMT_PSAProsperity-Dielectrics-PSAProsperity-Dielectrics-FN15N2R2C500PNG_C525207.html
footprint CAP-0402 (0402 (1005M) Capacitor)
pins: 1, 2

## FN15N2R7B500PNG
designator C?  Capacitance: 2.7pF  (hidden comment: *)
Capacitor, Ceramic (MLCC), 2.7pF, 50V, C0G, SMD 0402; Manufacturer: PSA(Prosperity Dielectrics); Manufacturer Part Number: FN15N2R7B500PNG; Package Size: 0402; JLCPCB Basic Part: No; JLCPCB Part Number: C565489; Supplier 1: LCSC; Category: Capacitors - MLCC; Supplier Part Number 1: C565489; Voltage Rating: 50V; Temperature Coefficient: C0G; RoHS: Yes; ComponentLink1Description: Datasheet; ComponentLink2Description: JLCPCB Part URL; ComponentLink2URL: https://jlcpcb.com/partdetail/C565489; ComponentLink3Description: LCSC Part URL; ComponentLink3URL: https://lcsc.com/product-detail/Multilayer-Ceramic-Capacitors-MLCC---SMD-SMT_PSAProsperity-Dielectrics-PSAProsperity-Dielectrics-FN15N2R7B500PNG_C565489.html
footprint CAP-0402 (0402 (1005M) Capacitor)
pins: 1, 2

## FN15N2R7C500PNG
designator C?  Capacitance: 2.7pF  (hidden comment: *)
Capacitor, Ceramic (MLCC), 2.7pF, 50V, C0G, SMD 0402; Manufacturer: PSA(Prosperity Dielectrics); Manufacturer Part Number: FN15N2R7C500PNG; Package Size: 0402; JLCPCB Basic Part: No; JLCPCB Part Number: C525208; Supplier 1: LCSC; Category: Capacitors - MLCC; Supplier Part Number 1: C525208; Voltage Rating: 50V; Temperature Coefficient: C0G; RoHS: Yes; ComponentLink1Description: Datasheet; ComponentLink1URL: https://wmsc.lcsc.com/wmsc/upload/file/pdf/v2/lcsc/2304140030_PSA-Prosperity-Dielectrics-FN15N2R7C500PNG_C525208.pdf; ComponentLink2Description: JLCPCB Part URL; ComponentLink2URL: https://jlcpcb.com/partdetail/C525208; ComponentLink3Description: LCSC Part URL; ComponentLink3URL: https://lcsc.com/product-detail/Multilayer-Ceramic-Capacitors-MLCC---SMD-SMT_PSAProsperity-Dielectrics-PSAProsperity-Dielectrics-FN15N2R7C500PNG_C525208.html
footprint CAP-0402 (0402 (1005M) Capacitor)
pins: 1, 2

## FN15N3R0C500PNG
designator C?  Capacitance: 3pF  (hidden comment: *)
Capacitor, Ceramic (MLCC), 3pF, 50V, C0G, SMD 0402; Manufacturer: PSA(Prosperity Dielectrics); Manufacturer Part Number: FN15N3R0C500PNG; Package Size: 0402; JLCPCB Basic Part: No; JLCPCB Part Number: C363518; Supplier 1: LCSC; Category: Capacitors - MLCC; Supplier Part Number 1: C363518; Voltage Rating: 50V; Temperature Coefficient: C0G; RoHS: Yes; ComponentLink1Description: Datasheet; ComponentLink1URL: https://wmsc.lcsc.com/wmsc/upload/file/pdf/v2/lcsc/2304140030_PSA-Prosperity-Dielectrics-FN15N3R0C500PNG_C363518.pdf; ComponentLink2Description: JLCPCB Part URL; ComponentLink2URL: https://jlcpcb.com/partdetail/C363518; ComponentLink3Description: LCSC Part URL; ComponentLink3URL: https://lcsc.com/product-detail/Multilayer-Ceramic-Capacitors-MLCC---SMD-SMT_PSAProsperity-Dielectrics-PSAProsperity-Dielectrics-FN15N3R0C500PNG_C363518.html
footprint CAP-0402 (0402 (1005M) Capacitor)
pins: 1, 2
